# Altium footprint library HLib_footprint_Hien.PcbLib: 58 footprints (part 1 of 4)
Each footprint in its own frame and in the unit in brackets; x right, y up, seen from the top. Pads: shape width x height; smd on the part's side, far side on the other; paste and mask are expansions set on the pad; w line width, h text height; cw(c..) or ccw(c..) is an arc to the next point about the centre after c.
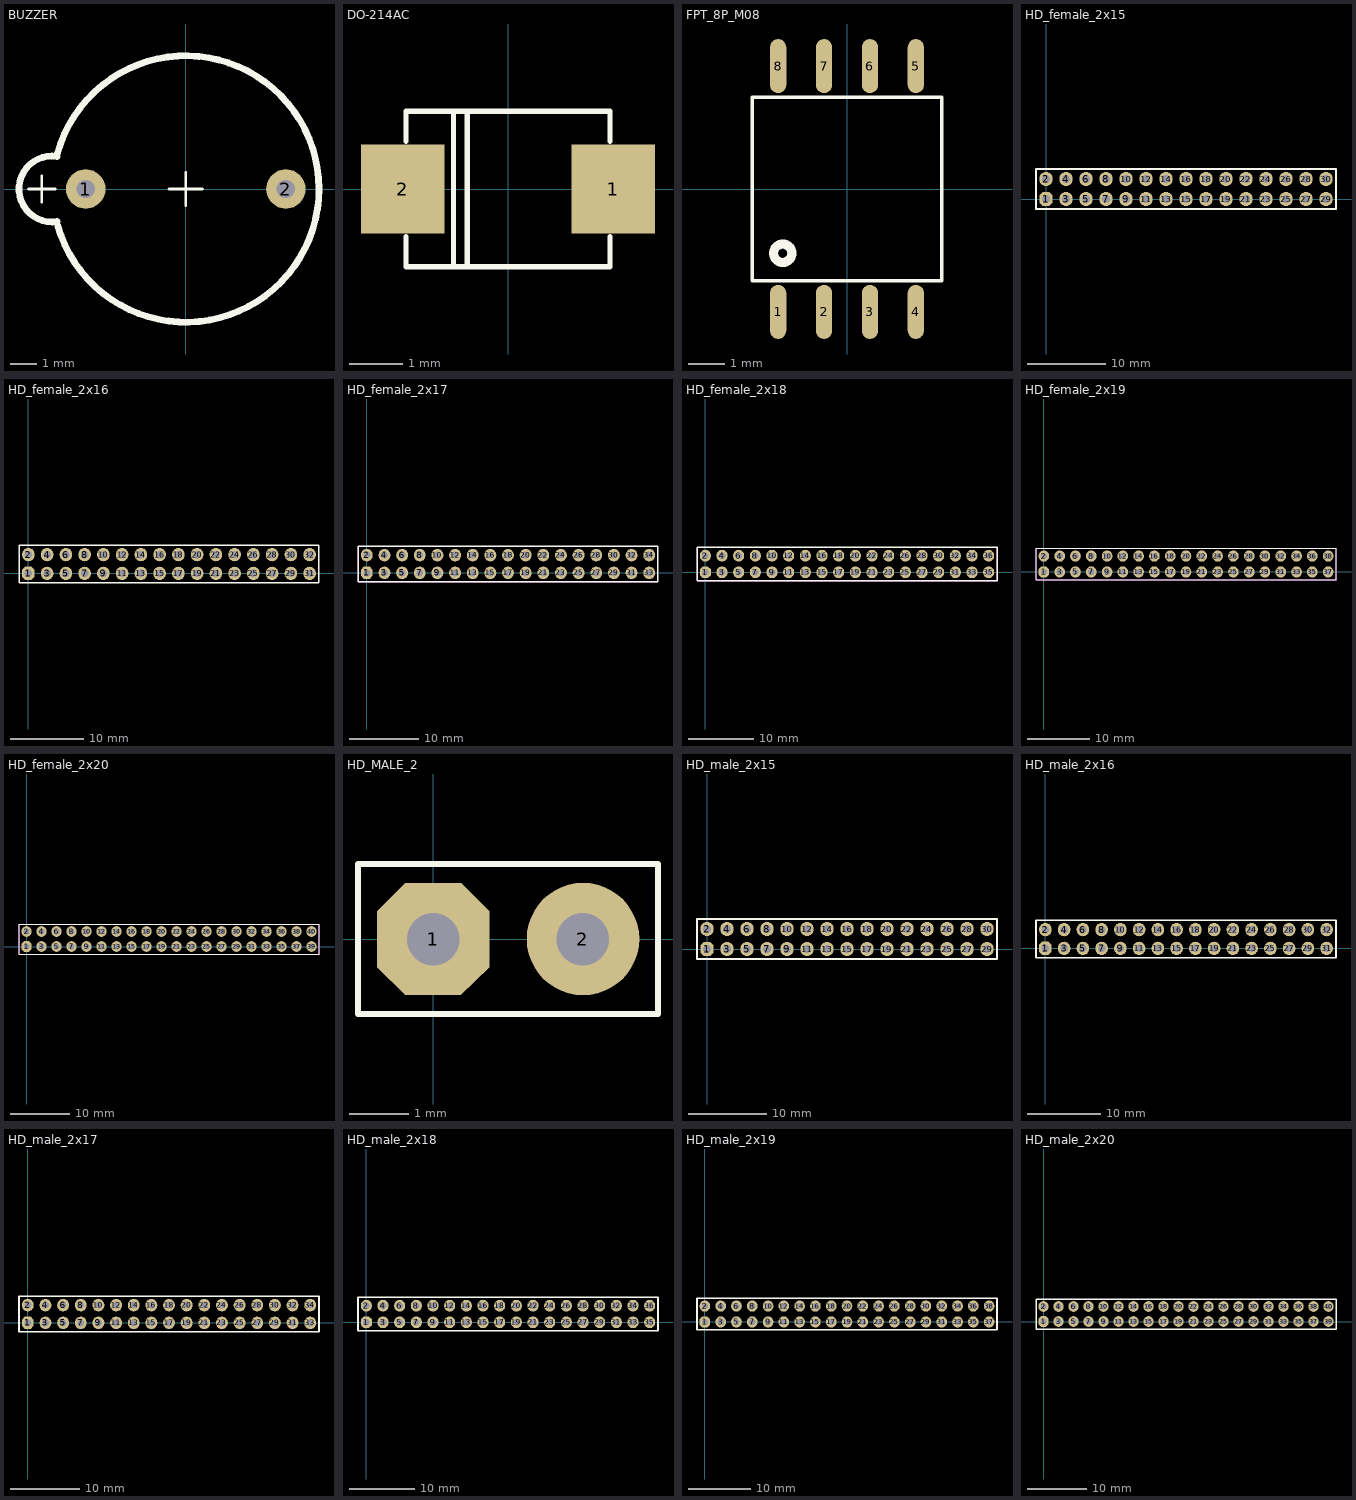
[diagram p0: the footprints below, top view; thin cyan lines are the x and y axes]

## BUZZER [mm]
pads (2):
  round 1.5 hole 0.7: 1(-3.8,0) 2(3.8,0)
Top Overlay:
  lines w0.1: -5.969,0 -4.953,0 ; -5.461,-0.508 -5.461,0.508 ; -0.635,0 0.635,0 ; 0,-0.635 0,0.635
  lines w0.254: -4.889,1.236 ccw(c-5.08,0) -4.886,-1.236 ; -4.869,1.363 cw(c0,0) -4.862,-1.389

## DO-214AC [mm]
pads (2):
  rect 1.555x1.67 smd: 1(1.965,0) 2(-1.965,0)
Top Overlay:
  lines w0.1: -1.905,-0.889 -1.905,-1.45 1.905,-1.45 1.905,-0.889 ; -1.905,0.889 -1.905,1.45 1.905,1.45 1.905,0.889 ; -1.016,-1.45 -1.016,1.45 ; -0.762,-1.45 -0.762,1.45
3D body: height 1.14, standoff -1.14, extent -2.743,-1.397 2.743,1.397

## FPT_8P_M08 [mm] "SOT8"
pads (8):
  oval 0.45x1.5 smd: 1(-1.905,-3.4) 2(-0.635,-3.4) 3(0.635,-3.4) 4(1.905,-3.4) 5(1.905,3.4) 6(0.635,3.4) 7(-0.635,3.4) 8(-1.905,3.4)
Top Overlay:
  circle w0.254: c-1.778,-1.778 r0.254
  lines w0.1: -2.62,-2.54 -2.62,2.54 2.62,2.54 2.62,-2.54 -2.62,-2.54
3D body: height 1.6, standoff 0, extent -2.51,-3.021 2.51,3.021

## HD_female_2x15 [mm]
pads (30):
  oct 1.7x1.8 hole 1: 1(0,0)
  oval 1.7x1.8 hole 1: 2(0,2.54) 3(2.54,0) 4(2.54,2.54) 5(5.08,0) 6(5.08,2.54) 7(7.62,0) 8(7.62,2.54) 9(10.16,0) 10(10.16,2.54) 11(12.7,0) 12(12.7,2.54) 13(15.24,0) 14(15.24,2.54) 15(17.78,0) 16(17.78,2.54) 17(20.32,0) 18(20.32,2.54) 19(22.86,0) 20(22.86,2.54) 21(25.4,0) 22(25.4,2.54) 23(27.94,0) 24(27.94,2.54) 25(30.48,0) 26(30.48,2.54) 27(33.02,0) 28(33.02,2.54) 29(35.56,0) 30(35.56,2.54)
Top Overlay:
  lines w0.2: -1.27,-1.27 -1.27,3.81 11.43,3.81 24.13,3.81 36.83,3.81 36.83,-1.27 24.13,-1.27 11.43,-1.27 -1.27,-1.27
Mechanical 15 keep-out:
  lines w0.1: -1.27,-1.27 -1.27,3.81 11.43,3.81 24.13,3.81 36.83,3.81 36.83,-1.27 24.13,-1.27 11.43,-1.27 -1.27,-1.27
3D body: height 8, standoff 0, extent 22.86,-1.27 24.13,3.81
3D body: height 8, standoff 0, extent 20.32,-1.27 21.59,3.81
3D body: height 8, standoff 0, extent 17.78,-1.27 19.05,3.81
3D body: height 8, standoff 0, extent 15.24,-1.27 16.51,3.81
3D body: height 8, standoff 0, extent 12.7,-1.27 13.97,3.81
3D body: height 8, standoff 0, extent 21.59,-1.27 22.86,3.81
3D body: height 8, standoff 0, extent 19.05,-1.27 20.32,3.81
3D body: height 8, standoff 0, extent 16.51,-1.27 17.78,3.81
3D body: height 8, standoff 0, extent 13.97,-1.27 15.24,3.81
3D body: height 8, standoff 0, extent 11.43,-1.27 12.7,3.81
3D body: height 0, standoff -1, extent 22.606,2.286 23.114,2.794
3D body: height 0, standoff -1, extent 22.606,-0.254 23.114,0.254
3D body: height 0, standoff -1, extent 20.066,2.286 20.574,2.794
3D body: height 0, standoff -1, extent 20.066,-0.254 20.574,0.254
3D body: height 0, standoff -1, extent 17.526,2.286 18.034,2.794
3D body: height 0, standoff -1, extent 17.526,-0.254 18.034,0.254
3D body: height 0, standoff -1, extent 14.986,2.286 15.494,2.794
3D body: height 0, standoff -1, extent 14.986,-0.254 15.494,0.254
3D body: height 0, standoff -1, extent 12.446,2.286 12.954,2.794
3D body: height 0, standoff -1, extent 12.446,-0.254 12.954,0.254
3D body: height 8, standoff 0, extent 10.16,-1.27 11.43,3.81
3D body: height 8, standoff 0, extent 7.62,-1.27 8.89,3.81
3D body: height 8, standoff 0, extent 5.08,-1.27 6.35,3.81
3D body: height 8, standoff 0, extent 2.54,-1.27 3.81,3.81
3D body: height 8, standoff 0, extent 0,-1.27 1.27,3.81
3D body: height 8, standoff 0, extent 8.89,-1.27 10.16,3.81
3D body: height 8, standoff 0, extent 6.35,-1.27 7.62,3.81
3D body: height 8, standoff 0, extent 3.81,-1.27 5.08,3.81
3D body: height 8, standoff 0, extent 1.27,-1.27 2.54,3.81
3D body: height 8, standoff 0, extent -1.27,-1.27 0,3.81
3D body: height 0, standoff -1, extent 9.906,2.286 10.414,2.794
3D body: height 0, standoff -1, extent 9.906,-0.254 10.414,0.254
3D body: height 0, standoff -1, extent 7.366,2.286 7.874,2.794
3D body: height 0, standoff -1, extent 7.366,-0.254 7.874,0.254
3D body: height 0, standoff -1, extent 4.826,2.286 5.334,2.794
3D body: height 0, standoff -1, extent 4.826,-0.254 5.334,0.254
3D body: height 0, standoff -1, extent 2.286,2.286 2.794,2.794
3D body: height 0, standoff -1, extent 2.286,-0.254 2.794,0.254
3D body: height 0, standoff -1, extent -0.254,2.286 0.254,2.794
3D body: height 0, standoff -1, extent -0.254,-0.254 0.254,0.254
3D body: height 0, standoff -1, extent 25.146,-0.254 25.654,0.254
3D body: height 0, standoff -1, extent 25.146,2.286 25.654,2.794
3D body: height 0, standoff -1, extent 27.686,-0.254 28.194,0.254
3D body: height 0, standoff -1, extent 27.686,2.286 28.194,2.794
3D body: height 0, standoff -1, extent 30.226,-0.254 30.734,0.254
3D body: height 0, standoff -1, extent 30.226,2.286 30.734,2.794
3D body: height 0, standoff -1, extent 32.766,-0.254 33.274,0.254
3D body: height 0, standoff -1, extent 32.766,2.286 33.274,2.794
3D body: height 0, standoff -1, extent 35.306,-0.254 35.814,0.254
3D body: height 0, standoff -1, extent 35.306,2.286 35.814,2.794
3D body: height 8, standoff 0, extent 24.13,-1.27 25.4,3.81
3D body: height 8, standoff 0, extent 26.67,-1.27 27.94,3.81
3D body: height 8, standoff 0, extent 29.21,-1.27 30.48,3.81
3D body: height 8, standoff 0, extent 31.75,-1.27 33.02,3.81
3D body: height 8, standoff 0, extent 34.29,-1.27 35.56,3.81
3D body: height 8, standoff 0, extent 25.4,-1.27 26.67,3.81
3D body: height 8, standoff 0, extent 27.94,-1.27 29.21,3.81
3D body: height 8, standoff 0, extent 30.48,-1.27 31.75,3.81
3D body: height 8, standoff 0, extent 33.02,-1.27 34.29,3.81
3D body: height 8, standoff 0, extent 35.56,-1.27 36.83,3.81

## HD_female_2x16 [mm]
pads (32):
  oct 1.7x1.8 hole 1: 1(0,0)
  oval 1.7x1.8 hole 1: 2(0,2.54) 3(2.54,0) 4(2.54,2.54) 5(5.08,0) 6(5.08,2.54) 7(7.62,0) 8(7.62,2.54) 9(10.16,0) 10(10.16,2.54) 11(12.7,0) 12(12.7,2.54) 13(15.24,0) 14(15.24,2.54) 15(17.78,0) 16(17.78,2.54) 17(20.32,0) 18(20.32,2.54) 19(22.86,0) 20(22.86,2.54) 21(25.4,0) 22(25.4,2.54) 23(27.94,0) 24(27.94,2.54) 25(30.48,0) 26(30.48,2.54) 27(33.02,0) 28(33.02,2.54) 29(35.56,0) 30(35.56,2.54) 31(38.1,0) 32(38.1,2.54)
Top Overlay:
  lines w0.2: -1.27,-1.27 -1.27,3.81 11.43,3.81 24.13,3.81 39.37,3.81 39.37,-1.27 24.13,-1.27 11.43,-1.27 -1.27,-1.27
3D body: height 8, standoff 0, extent 38.1,-1.27 39.37,3.81
3D body: height 8, standoff 0, extent 36.83,-1.27 38.1,3.81
3D body: height 0, standoff -1, extent 37.846,2.286 38.354,2.794
3D body: height 0, standoff -1, extent 37.846,-0.254 38.354,0.254
3D body: height 8, standoff 0, extent 22.86,-1.27 24.13,3.81
3D body: height 8, standoff 0, extent 20.32,-1.27 21.59,3.81
3D body: height 8, standoff 0, extent 17.78,-1.27 19.05,3.81
3D body: height 8, standoff 0, extent 15.24,-1.27 16.51,3.81
3D body: height 8, standoff 0, extent 12.7,-1.27 13.97,3.81
3D body: height 8, standoff 0, extent 21.59,-1.27 22.86,3.81
3D body: height 8, standoff 0, extent 19.05,-1.27 20.32,3.81
3D body: height 8, standoff 0, extent 16.51,-1.27 17.78,3.81
3D body: height 8, standoff 0, extent 13.97,-1.27 15.24,3.81
3D body: height 8, standoff 0, extent 11.43,-1.27 12.7,3.81
3D body: height 0, standoff -1, extent 22.606,2.286 23.114,2.794
3D body: height 0, standoff -1, extent 22.606,-0.254 23.114,0.254
3D body: height 0, standoff -1, extent 20.066,2.286 20.574,2.794
3D body: height 0, standoff -1, extent 20.066,-0.254 20.574,0.254
3D body: height 0, standoff -1, extent 17.526,2.286 18.034,2.794
3D body: height 0, standoff -1, extent 17.526,-0.254 18.034,0.254
3D body: height 0, standoff -1, extent 14.986,2.286 15.494,2.794
3D body: height 0, standoff -1, extent 14.986,-0.254 15.494,0.254
3D body: height 0, standoff -1, extent 12.446,2.286 12.954,2.794
3D body: height 0, standoff -1, extent 12.446,-0.254 12.954,0.254
3D body: height 8, standoff 0, extent 10.16,-1.27 11.43,3.81
3D body: height 8, standoff 0, extent 7.62,-1.27 8.89,3.81
3D body: height 8, standoff 0, extent 5.08,-1.27 6.35,3.81
3D body: height 8, standoff 0, extent 2.54,-1.27 3.81,3.81
3D body: height 8, standoff 0, extent 0,-1.27 1.27,3.81
3D body: height 8, standoff 0, extent 8.89,-1.27 10.16,3.81
3D body: height 8, standoff 0, extent 6.35,-1.27 7.62,3.81
3D body: height 8, standoff 0, extent 3.81,-1.27 5.08,3.81
3D body: height 8, standoff 0, extent 1.27,-1.27 2.54,3.81
3D body: height 8, standoff 0, extent -1.27,-1.27 0,3.81
3D body: height 0, standoff -1, extent 9.906,2.286 10.414,2.794
3D body: height 0, standoff -1, extent 9.906,-0.254 10.414,0.254
3D body: height 0, standoff -1, extent 7.366,2.286 7.874,2.794
3D body: height 0, standoff -1, extent 7.366,-0.254 7.874,0.254
3D body: height 0, standoff -1, extent 4.826,2.286 5.334,2.794
3D body: height 0, standoff -1, extent 4.826,-0.254 5.334,0.254
3D body: height 0, standoff -1, extent 2.286,2.286 2.794,2.794
3D body: height 0, standoff -1, extent 2.286,-0.254 2.794,0.254
3D body: height 0, standoff -1, extent -0.254,2.286 0.254,2.794
3D body: height 0, standoff -1, extent -0.254,-0.254 0.254,0.254
3D body: height 0, standoff -1, extent 25.146,-0.254 25.654,0.254
3D body: height 0, standoff -1, extent 25.146,2.286 25.654,2.794
3D body: height 0, standoff -1, extent 27.686,-0.254 28.194,0.254
3D body: height 0, standoff -1, extent 27.686,2.286 28.194,2.794
3D body: height 0, standoff -1, extent 30.226,-0.254 30.734,0.254
3D body: height 0, standoff -1, extent 30.226,2.286 30.734,2.794
3D body: height 0, standoff -1, extent 32.766,-0.254 33.274,0.254
3D body: height 0, standoff -1, extent 32.766,2.286 33.274,2.794
3D body: height 0, standoff -1, extent 35.306,-0.254 35.814,0.254
3D body: height 0, standoff -1, extent 35.306,2.286 35.814,2.794
3D body: height 8, standoff 0, extent 24.13,-1.27 25.4,3.81
3D body: height 8, standoff 0, extent 26.67,-1.27 27.94,3.81
3D body: height 8, standoff 0, extent 29.21,-1.27 30.48,3.81
3D body: height 8, standoff 0, extent 31.75,-1.27 33.02,3.81
3D body: height 8, standoff 0, extent 34.29,-1.27 35.56,3.81
3D body: height 8, standoff 0, extent 25.4,-1.27 26.67,3.81
3D body: height 8, standoff 0, extent 27.94,-1.27 29.21,3.81
3D body: height 8, standoff 0, extent 30.48,-1.27 31.75,3.81
3D body: height 8, standoff 0, extent 33.02,-1.27 34.29,3.81
3D body: height 8, standoff 0, extent 35.56,-1.27 36.83,3.81

## HD_female_2x17 [mm]
pads (34):
  oct 1.7x1.8 hole 1: 1(0,0)
  oval 1.7x1.8 hole 1: 2(0,2.54) 3(2.54,0) 4(2.54,2.54) 5(5.08,0) 6(5.08,2.54) 7(7.62,0) 8(7.62,2.54) 9(10.16,0) 10(10.16,2.54) 11(12.7,0) 12(12.7,2.54) 13(15.24,0) 14(15.24,2.54) 15(17.78,0) 16(17.78,2.54) 17(20.32,0) 18(20.32,2.54) 19(22.86,0) 20(22.86,2.54) 21(25.4,0) 22(25.4,2.54) 23(27.94,0) 24(27.94,2.54) 25(30.48,0) 26(30.48,2.54) 27(33.02,0) 28(33.02,2.54) 29(35.56,0) 30(35.56,2.54) 31(38.1,0) 32(38.1,2.54) 33(40.64,0) 34(40.64,2.54)
Top Overlay:
  lines w0.2: -1.27,-1.27 -1.27,3.81 11.43,3.81 24.13,3.81 41.91,3.81 41.91,-1.27 24.13,-1.27 11.43,-1.27 -1.27,-1.27
Mechanical 15 keep-out:
  lines w0.1: -1.27,-1.27 -1.27,3.81 11.43,3.81 24.13,3.81 41.91,3.81 41.91,-1.27 24.13,-1.27 11.43,-1.27 -1.27,-1.27
3D body: height 8, standoff 0, extent 22.86,-1.27 24.13,3.81
3D body: height 8, standoff 0, extent 20.32,-1.27 21.59,3.81
3D body: height 8, standoff 0, extent 17.78,-1.27 19.05,3.81
3D body: height 8, standoff 0, extent 15.24,-1.27 16.51,3.81
3D body: height 8, standoff 0, extent 12.7,-1.27 13.97,3.81
3D body: height 8, standoff 0, extent 21.59,-1.27 22.86,3.81
3D body: height 8, standoff 0, extent 19.05,-1.27 20.32,3.81
3D body: height 8, standoff 0, extent 16.51,-1.27 17.78,3.81
3D body: height 8, standoff 0, extent 13.97,-1.27 15.24,3.81
3D body: height 8, standoff 0, extent 11.43,-1.27 12.7,3.81
3D body: height 0, standoff -1, extent 22.606,2.286 23.114,2.794
3D body: height 0, standoff -1, extent 22.606,-0.254 23.114,0.254
3D body: height 0, standoff -1, extent 20.066,2.286 20.574,2.794
3D body: height 0, standoff -1, extent 20.066,-0.254 20.574,0.254
3D body: height 0, standoff -1, extent 17.526,2.286 18.034,2.794
3D body: height 0, standoff -1, extent 17.526,-0.254 18.034,0.254
3D body: height 0, standoff -1, extent 14.986,2.286 15.494,2.794
3D body: height 0, standoff -1, extent 14.986,-0.254 15.494,0.254
3D body: height 0, standoff -1, extent 12.446,2.286 12.954,2.794
3D body: height 0, standoff -1, extent 12.446,-0.254 12.954,0.254
3D body: height 8, standoff 0, extent 10.16,-1.27 11.43,3.81
3D body: height 8, standoff 0, extent 7.62,-1.27 8.89,3.81
3D body: height 8, standoff 0, extent 5.08,-1.27 6.35,3.81
3D body: height 8, standoff 0, extent 2.54,-1.27 3.81,3.81
3D body: height 8, standoff 0, extent 0,-1.27 1.27,3.81
3D body: height 8, standoff 0, extent 8.89,-1.27 10.16,3.81
3D body: height 8, standoff 0, extent 6.35,-1.27 7.62,3.81
3D body: height 8, standoff 0, extent 3.81,-1.27 5.08,3.81
3D body: height 8, standoff 0, extent 1.27,-1.27 2.54,3.81
3D body: height 8, standoff 0, extent -1.27,-1.27 0,3.81
3D body: height 0, standoff -1, extent 9.906,2.286 10.414,2.794
3D body: height 0, standoff -1, extent 9.906,-0.254 10.414,0.254
3D body: height 0, standoff -1, extent 7.366,2.286 7.874,2.794
3D body: height 0, standoff -1, extent 7.366,-0.254 7.874,0.254
3D body: height 0, standoff -1, extent 4.826,2.286 5.334,2.794
3D body: height 0, standoff -1, extent 4.826,-0.254 5.334,0.254
3D body: height 0, standoff -1, extent 2.286,2.286 2.794,2.794
3D body: height 0, standoff -1, extent 2.286,-0.254 2.794,0.254
3D body: height 0, standoff -1, extent -0.254,2.286 0.254,2.794
3D body: height 0, standoff -1, extent -0.254,-0.254 0.254,0.254
3D body: height 0, standoff -1, extent 25.146,-0.254 25.654,0.254
3D body: height 0, standoff -1, extent 25.146,2.286 25.654,2.794
3D body: height 0, standoff -1, extent 27.686,-0.254 28.194,0.254
3D body: height 0, standoff -1, extent 27.686,2.286 28.194,2.794
3D body: height 0, standoff -1, extent 30.226,-0.254 30.734,0.254
3D body: height 0, standoff -1, extent 30.226,2.286 30.734,2.794
3D body: height 0, standoff -1, extent 32.766,-0.254 33.274,0.254
3D body: height 0, standoff -1, extent 32.766,2.286 33.274,2.794
3D body: height 0, standoff -1, extent 35.306,-0.254 35.814,0.254
3D body: height 0, standoff -1, extent 35.306,2.286 35.814,2.794
3D body: height 8, standoff 0, extent 24.13,-1.27 25.4,3.81
3D body: height 8, standoff 0, extent 26.67,-1.27 27.94,3.81
3D body: height 8, standoff 0, extent 29.21,-1.27 30.48,3.81
3D body: height 8, standoff 0, extent 31.75,-1.27 33.02,3.81
3D body: height 8, standoff 0, extent 34.29,-1.27 35.56,3.81
3D body: height 8, standoff 0, extent 25.4,-1.27 26.67,3.81
3D body: height 8, standoff 0, extent 27.94,-1.27 29.21,3.81
3D body: height 8, standoff 0, extent 30.48,-1.27 31.75,3.81
3D body: height 8, standoff 0, extent 33.02,-1.27 34.29,3.81
3D body: height 8, standoff 0, extent 35.56,-1.27 36.83,3.81
3D body: height 8, standoff 0, extent 40.64,-1.27 41.91,3.81
3D body: height 8, standoff 0, extent 38.1,-1.27 39.37,3.81
3D body: height 8, standoff 0, extent 39.37,-1.27 40.64,3.81
3D body: height 8, standoff 0, extent 36.83,-1.27 38.1,3.81
3D body: height 0, standoff -1, extent 40.386,2.286 40.894,2.794
3D body: height 0, standoff -1, extent 40.386,-0.254 40.894,0.254
3D body: height 0, standoff -1, extent 37.846,2.286 38.354,2.794
3D body: height 0, standoff -1, extent 37.846,-0.254 38.354,0.254

## HD_female_2x18 [mm]
pads (36):
  oct 1.7x1.8 hole 1: 1(0,0)
  oval 1.7x1.8 hole 1: 2(0,2.54) 3(2.54,0) 4(2.54,2.54) 5(5.08,0) 6(5.08,2.54) 7(7.62,0) 8(7.62,2.54) 9(10.16,0) 10(10.16,2.54) 11(12.7,0) 12(12.7,2.54) 13(15.24,0) 14(15.24,2.54) 15(17.78,0) 16(17.78,2.54) 17(20.32,0) 18(20.32,2.54) 19(22.86,0) 20(22.86,2.54) 21(25.4,0) 22(25.4,2.54) 23(27.94,0) 24(27.94,2.54) 25(30.48,0) 26(30.48,2.54) 27(33.02,0) 28(33.02,2.54) 29(35.56,0) 30(35.56,2.54) 31(38.1,0) 32(38.1,2.54) 33(40.64,0) 34(40.64,2.54) 35(43.18,0) 36(43.18,2.54)
Top Overlay:
  lines w0.2: -1.27,-1.27 -1.27,3.81 11.43,3.81 24.13,3.81 44.45,3.81 44.45,-1.27 24.13,-1.27 11.43,-1.27 -1.27,-1.27
Mechanical 15 keep-out:
  lines w0.1: -1.27,-1.27 -1.27,3.81 11.43,3.81 24.13,3.81 44.45,3.81 44.45,-1.27 24.13,-1.27 11.43,-1.27 -1.27,-1.27
3D body: height 8, standoff 0, extent 22.86,-1.27 24.13,3.81
3D body: height 8, standoff 0, extent 20.32,-1.27 21.59,3.81
3D body: height 8, standoff 0, extent 17.78,-1.27 19.05,3.81
3D body: height 8, standoff 0, extent 15.24,-1.27 16.51,3.81
3D body: height 8, standoff 0, extent 12.7,-1.27 13.97,3.81
3D body: height 8, standoff 0, extent 21.59,-1.27 22.86,3.81
3D body: height 8, standoff 0, extent 19.05,-1.27 20.32,3.81
3D body: height 8, standoff 0, extent 16.51,-1.27 17.78,3.81
3D body: height 8, standoff 0, extent 13.97,-1.27 15.24,3.81
3D body: height 8, standoff 0, extent 11.43,-1.27 12.7,3.81
3D body: height 0, standoff -1, extent 22.606,2.286 23.114,2.794
3D body: height 0, standoff -1, extent 22.606,-0.254 23.114,0.254
3D body: height 0, standoff -1, extent 20.066,2.286 20.574,2.794
3D body: height 0, standoff -1, extent 20.066,-0.254 20.574,0.254
3D body: height 0, standoff -1, extent 17.526,2.286 18.034,2.794
3D body: height 0, standoff -1, extent 17.526,-0.254 18.034,0.254
3D body: height 0, standoff -1, extent 14.986,2.286 15.494,2.794
3D body: height 0, standoff -1, extent 14.986,-0.254 15.494,0.254
3D body: height 0, standoff -1, extent 12.446,2.286 12.954,2.794
3D body: height 0, standoff -1, extent 12.446,-0.254 12.954,0.254
3D body: height 8, standoff 0, extent 10.16,-1.27 11.43,3.81
3D body: height 8, standoff 0, extent 7.62,-1.27 8.89,3.81
3D body: height 8, standoff 0, extent 5.08,-1.27 6.35,3.81
3D body: height 8, standoff 0, extent 2.54,-1.27 3.81,3.81
3D body: height 8, standoff 0, extent 0,-1.27 1.27,3.81
3D body: height 8, standoff 0, extent 8.89,-1.27 10.16,3.81
3D body: height 8, standoff 0, extent 6.35,-1.27 7.62,3.81
3D body: height 8, standoff 0, extent 3.81,-1.27 5.08,3.81
3D body: height 8, standoff 0, extent 1.27,-1.27 2.54,3.81
3D body: height 8, standoff 0, extent -1.27,-1.27 0,3.81
3D body: height 0, standoff -1, extent 9.906,2.286 10.414,2.794
3D body: height 0, standoff -1, extent 9.906,-0.254 10.414,0.254
3D body: height 0, standoff -1, extent 7.366,2.286 7.874,2.794
3D body: height 0, standoff -1, extent 7.366,-0.254 7.874,0.254
3D body: height 0, standoff -1, extent 4.826,2.286 5.334,2.794
3D body: height 0, standoff -1, extent 4.826,-0.254 5.334,0.254
3D body: height 0, standoff -1, extent 2.286,2.286 2.794,2.794
3D body: height 0, standoff -1, extent 2.286,-0.254 2.794,0.254
3D body: height 0, standoff -1, extent -0.254,2.286 0.254,2.794
3D body: height 0, standoff -1, extent -0.254,-0.254 0.254,0.254
3D body: height 0, standoff -1, extent 25.146,-0.254 25.654,0.254
3D body: height 0, standoff -1, extent 25.146,2.286 25.654,2.794
3D body: height 0, standoff -1, extent 27.686,-0.254 28.194,0.254
3D body: height 0, standoff -1, extent 27.686,2.286 28.194,2.794
3D body: height 0, standoff -1, extent 30.226,-0.254 30.734,0.254
3D body: height 0, standoff -1, extent 30.226,2.286 30.734,2.794
3D body: height 0, standoff -1, extent 32.766,-0.254 33.274,0.254
3D body: height 0, standoff -1, extent 32.766,2.286 33.274,2.794
3D body: height 0, standoff -1, extent 35.306,-0.254 35.814,0.254
3D body: height 0, standoff -1, extent 35.306,2.286 35.814,2.794
3D body: height 8, standoff 0, extent 24.13,-1.27 25.4,3.81
3D body: height 8, standoff 0, extent 26.67,-1.27 27.94,3.81
3D body: height 8, standoff 0, extent 29.21,-1.27 30.48,3.81
3D body: height 8, standoff 0, extent 31.75,-1.27 33.02,3.81
3D body: height 8, standoff 0, extent 34.29,-1.27 35.56,3.81
3D body: height 8, standoff 0, extent 25.4,-1.27 26.67,3.81
3D body: height 8, standoff 0, extent 27.94,-1.27 29.21,3.81
3D body: height 8, standoff 0, extent 30.48,-1.27 31.75,3.81
3D body: height 8, standoff 0, extent 33.02,-1.27 34.29,3.81
3D body: height 8, standoff 0, extent 35.56,-1.27 36.83,3.81
3D body: height 8, standoff 0, extent 40.64,-1.27 41.91,3.81
3D body: height 8, standoff 0, extent 38.1,-1.27 39.37,3.81
3D body: height 8, standoff 0, extent 39.37,-1.27 40.64,3.81
3D body: height 8, standoff 0, extent 36.83,-1.27 38.1,3.81
3D body: height 0, standoff -1, extent 40.386,2.286 40.894,2.794
3D body: height 0, standoff -1, extent 40.386,-0.254 40.894,0.254
3D body: height 0, standoff -1, extent 37.846,2.286 38.354,2.794
3D body: height 0, standoff -1, extent 37.846,-0.254 38.354,0.254
3D body: height 0, standoff -1, extent 42.926,-0.254 43.434,0.254
3D body: height 0, standoff -1, extent 42.926,2.286 43.434,2.794
3D body: height 8, standoff 0, extent 41.91,-1.27 43.18,3.81
3D body: height 8, standoff 0, extent 43.18,-1.27 44.45,3.81

## HD_female_2x19 [mm]
pads (38):
  oct 1.7x1.8 hole 1: 1(0,0)
  oval 1.7x1.8 hole 1: 2(0,2.54) 3(2.54,0) 4(2.54,2.54) 5(5.08,0) 6(5.08,2.54) 7(7.62,0) 8(7.62,2.54) 9(10.16,0) 10(10.16,2.54) 11(12.7,0) 12(12.7,2.54) 13(15.24,0) 14(15.24,2.54) 15(17.78,0) 16(17.78,2.54) 17(20.32,0) 18(20.32,2.54) 19(22.86,0) 20(22.86,2.54) 21(25.4,0) 22(25.4,2.54) 23(27.94,0) 24(27.94,2.54) 25(30.48,0) 26(30.48,2.54) 27(33.02,0) 28(33.02,2.54) 29(35.56,0) 30(35.56,2.54) 31(38.1,0) 32(38.1,2.54) 33(40.64,0) 34(40.64,2.54) 35(43.18,0) 36(43.18,2.54) 37(45.72,0) 38(45.72,2.54)
Top Overlay:
  lines w0.2: -1.27,-1.27 -1.27,3.81 11.43,3.81 24.13,3.81 46.99,3.81 46.99,-1.27 24.13,-1.27 11.43,-1.27 -1.27,-1.27
Mechanical 15 keep-out:
  lines w0.1: -1.27,-1.27 -1.27,3.81 11.43,3.81 24.13,3.81 46.99,3.81 46.99,-1.27 24.13,-1.27 11.43,-1.27 -1.27,-1.27
3D body: height 8, standoff 0, extent 45.72,-1.27 46.99,3.81
3D body: height 8, standoff 0, extent 44.45,-1.27 45.72,3.81
3D body: height 8, standoff 0, extent 22.86,-1.27 24.13,3.81
3D body: height 8, standoff 0, extent 20.32,-1.27 21.59,3.81
3D body: height 8, standoff 0, extent 17.78,-1.27 19.05,3.81
3D body: height 8, standoff 0, extent 15.24,-1.27 16.51,3.81
3D body: height 8, standoff 0, extent 12.7,-1.27 13.97,3.81
3D body: height 8, standoff 0, extent 21.59,-1.27 22.86,3.81
3D body: height 8, standoff 0, extent 19.05,-1.27 20.32,3.81
3D body: height 8, standoff 0, extent 16.51,-1.27 17.78,3.81
3D body: height 8, standoff 0, extent 13.97,-1.27 15.24,3.81
3D body: height 8, standoff 0, extent 11.43,-1.27 12.7,3.81
3D body: height 0, standoff -1, extent 22.606,2.286 23.114,2.794
3D body: height 0, standoff -1, extent 22.606,-0.254 23.114,0.254
3D body: height 0, standoff -1, extent 20.066,2.286 20.574,2.794
3D body: height 0, standoff -1, extent 20.066,-0.254 20.574,0.254
3D body: height 0, standoff -1, extent 17.526,2.286 18.034,2.794
3D body: height 0, standoff -1, extent 17.526,-0.254 18.034,0.254
3D body: height 0, standoff -1, extent 14.986,2.286 15.494,2.794
3D body: height 0, standoff -1, extent 14.986,-0.254 15.494,0.254
3D body: height 0, standoff -1, extent 12.446,2.286 12.954,2.794
3D body: height 0, standoff -1, extent 12.446,-0.254 12.954,0.254
3D body: height 8, standoff 0, extent 10.16,-1.27 11.43,3.81
3D body: height 8, standoff 0, extent 7.62,-1.27 8.89,3.81
3D body: height 8, standoff 0, extent 5.08,-1.27 6.35,3.81
3D body: height 8, standoff 0, extent 2.54,-1.27 3.81,3.81
3D body: height 8, standoff 0, extent 0,-1.27 1.27,3.81
3D body: height 8, standoff 0, extent 8.89,-1.27 10.16,3.81
3D body: height 8, standoff 0, extent 6.35,-1.27 7.62,3.81
3D body: height 8, standoff 0, extent 3.81,-1.27 5.08,3.81
3D body: height 8, standoff 0, extent 1.27,-1.27 2.54,3.81
3D body: height 8, standoff 0, extent -1.27,-1.27 0,3.81
3D body: height 0, standoff -1, extent 9.906,2.286 10.414,2.794
3D body: height 0, standoff -1, extent 9.906,-0.254 10.414,0.254
3D body: height 0, standoff -1, extent 7.366,2.286 7.874,2.794
3D body: height 0, standoff -1, extent 7.366,-0.254 7.874,0.254
3D body: height 0, standoff -1, extent 4.826,2.286 5.334,2.794
3D body: height 0, standoff -1, extent 4.826,-0.254 5.334,0.254
3D body: height 0, standoff -1, extent 2.286,2.286 2.794,2.794
3D body: height 0, standoff -1, extent 2.286,-0.254 2.794,0.254
3D body: height 0, standoff -1, extent -0.254,2.286 0.254,2.794
3D body: height 0, standoff -1, extent -0.254,-0.254 0.254,0.254
3D body: height 0, standoff -1, extent 25.146,-0.254 25.654,0.254
3D body: height 0, standoff -1, extent 25.146,2.286 25.654,2.794
3D body: height 0, standoff -1, extent 27.686,-0.254 28.194,0.254
3D body: height 0, standoff -1, extent 27.686,2.286 28.194,2.794
3D body: height 0, standoff -1, extent 30.226,-0.254 30.734,0.254
3D body: height 0, standoff -1, extent 30.226,2.286 30.734,2.794
3D body: height 0, standoff -1, extent 32.766,-0.254 33.274,0.254
3D body: height 0, standoff -1, extent 32.766,2.286 33.274,2.794
3D body: height 0, standoff -1, extent 35.306,-0.254 35.814,0.254
3D body: height 0, standoff -1, extent 35.306,2.286 35.814,2.794
3D body: height 8, standoff 0, extent 24.13,-1.27 25.4,3.81
3D body: height 8, standoff 0, extent 26.67,-1.27 27.94,3.81
3D body: height 8, standoff 0, extent 29.21,-1.27 30.48,3.81
3D body: height 8, standoff 0, extent 31.75,-1.27 33.02,3.81
3D body: height 8, standoff 0, extent 34.29,-1.27 35.56,3.81
3D body: height 8, standoff 0, extent 25.4,-1.27 26.67,3.81
3D body: height 8, standoff 0, extent 27.94,-1.27 29.21,3.81
3D body: height 8, standoff 0, extent 30.48,-1.27 31.75,3.81
3D body: height 8, standoff 0, extent 33.02,-1.27 34.29,3.81
3D body: height 8, standoff 0, extent 35.56,-1.27 36.83,3.81
3D body: height 8, standoff 0, extent 40.64,-1.27 41.91,3.81
3D body: height 8, standoff 0, extent 38.1,-1.27 39.37,3.81
3D body: height 8, standoff 0, extent 39.37,-1.27 40.64,3.81
3D body: height 8, standoff 0, extent 36.83,-1.27 38.1,3.81
3D body: height 0, standoff -1, extent 40.386,2.286 40.894,2.794
3D body: height 0, standoff -1, extent 40.386,-0.254 40.894,0.254
3D body: height 0, standoff -1, extent 37.846,2.286 38.354,2.794
3D body: height 0, standoff -1, extent 37.846,-0.254 38.354,0.254
3D body: height 0, standoff -1, extent 42.926,-0.254 43.434,0.254
3D body: height 0, standoff -1, extent 42.926,2.286 43.434,2.794
3D body: height 8, standoff 0, extent 41.91,-1.27 43.18,3.81
3D body: height 8, standoff 0, extent 43.18,-1.27 44.45,3.81

## HD_female_2x20 [mm]
pads (40):
  oct 1.7x1.8 hole 1: 1(0,0)
  oval 1.7x1.8 hole 1: 2(0,2.54) 3(2.54,0) 4(2.54,2.54) 5(5.08,0) 6(5.08,2.54) 7(7.62,0) 8(7.62,2.54) 9(10.16,0) 10(10.16,2.54) 11(12.7,0) 12(12.7,2.54) 13(15.24,0) 14(15.24,2.54) 15(17.78,0) 16(17.78,2.54) 17(20.32,0) 18(20.32,2.54) 19(22.86,0) 20(22.86,2.54) 21(25.4,0) 22(25.4,2.54) 23(27.94,0) 24(27.94,2.54) 25(30.48,0) 26(30.48,2.54) 27(33.02,0) 28(33.02,2.54) 29(35.56,0) 30(35.56,2.54) 31(38.1,0) 32(38.1,2.54) 33(40.64,0) 34(40.64,2.54) 35(43.18,0) 36(43.18,2.54) 37(45.72,0) 38(45.72,2.54) 39(48.26,0) 40(48.26,2.54)
Top Overlay:
  lines w0.2: -1.27,-1.27 11.43,-1.27 24.13,-1.27 49.53,-1.27 49.53,3.81 24.13,3.81 11.43,3.81 -1.27,3.81 -1.27,-1.27
Mechanical 15 keep-out:
  lines w0.1: -1.27,-1.27 11.43,-1.27 24.13,-1.27 49.53,-1.27 49.53,3.81 24.13,3.81 11.43,3.81 -1.27,3.81 -1.27,-1.27
3D body: height 8, standoff 0, extent 43.18,-1.27 44.45,3.81
3D body: height 8, standoff 0, extent 41.91,-1.27 43.18,3.81
3D body: height 0, standoff -1, extent 42.926,2.286 43.434,2.794
3D body: height 0, standoff -1, extent 42.926,-0.254 43.434,0.254
3D body: height 0, standoff -1, extent 37.846,-0.254 38.354,0.254
3D body: height 0, standoff -1, extent 37.846,2.286 38.354,2.794
3D body: height 0, standoff -1, extent 40.386,-0.254 40.894,0.254
3D body: height 0, standoff -1, extent 40.386,2.286 40.894,2.794
3D body: height 8, standoff 0, extent 36.83,-1.27 38.1,3.81
3D body: height 8, standoff 0, extent 39.37,-1.27 40.64,3.81
3D body: height 8, standoff 0, extent 38.1,-1.27 39.37,3.81
3D body: height 8, standoff 0, extent 40.64,-1.27 41.91,3.81
3D body: height 8, standoff 0, extent 35.56,-1.27 36.83,3.81
3D body: height 8, standoff 0, extent 33.02,-1.27 34.29,3.81
3D body: height 8, standoff 0, extent 30.48,-1.27 31.75,3.81
3D body: height 8, standoff 0, extent 27.94,-1.27 29.21,3.81
3D body: height 8, standoff 0, extent 25.4,-1.27 26.67,3.81
3D body: height 8, standoff 0, extent 34.29,-1.27 35.56,3.81
3D body: height 8, standoff 0, extent 31.75,-1.27 33.02,3.81
3D body: height 8, standoff 0, extent 29.21,-1.27 30.48,3.81
3D body: height 8, standoff 0, extent 26.67,-1.27 27.94,3.81
3D body: height 8, standoff 0, extent 24.13,-1.27 25.4,3.81
3D body: height 0, standoff -1, extent 35.306,2.286 35.814,2.794
3D body: height 0, standoff -1, extent 35.306,-0.254 35.814,0.254
3D body: height 0, standoff -1, extent 32.766,2.286 33.274,2.794
3D body: height 0, standoff -1, extent 32.766,-0.254 33.274,0.254
3D body: height 0, standoff -1, extent 30.226,2.286 30.734,2.794
3D body: height 0, standoff -1, extent 30.226,-0.254 30.734,0.254
3D body: height 0, standoff -1, extent 27.686,2.286 28.194,2.794
3D body: height 0, standoff -1, extent 27.686,-0.254 28.194,0.254
3D body: height 0, standoff -1, extent 25.146,2.286 25.654,2.794
3D body: height 0, standoff -1, extent 25.146,-0.254 25.654,0.254
3D body: height 0, standoff -1, extent -0.254,-0.254 0.254,0.254
3D body: height 0, standoff -1, extent -0.254,2.286 0.254,2.794
3D body: height 0, standoff -1, extent 2.286,-0.254 2.794,0.254
3D body: height 0, standoff -1, extent 2.286,2.286 2.794,2.794
3D body: height 0, standoff -1, extent 4.826,-0.254 5.334,0.254
3D body: height 0, standoff -1, extent 4.826,2.286 5.334,2.794
3D body: height 0, standoff -1, extent 7.366,-0.254 7.874,0.254
3D body: height 0, standoff -1, extent 7.366,2.286 7.874,2.794
3D body: height 0, standoff -1, extent 9.906,-0.254 10.414,0.254
3D body: height 0, standoff -1, extent 9.906,2.286 10.414,2.794
3D body: height 8, standoff 0, extent -1.27,-1.27 0,3.81
3D body: height 8, standoff 0, extent 1.27,-1.27 2.54,3.81
3D body: height 8, standoff 0, extent 3.81,-1.27 5.08,3.81
3D body: height 8, standoff 0, extent 6.35,-1.27 7.62,3.81
3D body: height 8, standoff 0, extent 8.89,-1.27 10.16,3.81
3D body: height 8, standoff 0, extent 0,-1.27 1.27,3.81
3D body: height 8, standoff 0, extent 2.54,-1.27 3.81,3.81
3D body: height 8, standoff 0, extent 5.08,-1.27 6.35,3.81
3D body: height 8, standoff 0, extent 7.62,-1.27 8.89,3.81
3D body: height 8, standoff 0, extent 10.16,-1.27 11.43,3.81
3D body: height 0, standoff -1, extent 12.446,-0.254 12.954,0.254
3D body: height 0, standoff -1, extent 12.446,2.286 12.954,2.794
3D body: height 0, standoff -1, extent 14.986,-0.254 15.494,0.254
3D body: height 0, standoff -1, extent 14.986,2.286 15.494,2.794
3D body: height 0, standoff -1, extent 17.526,-0.254 18.034,0.254
3D body: height 0, standoff -1, extent 17.526,2.286 18.034,2.794
3D body: height 0, standoff -1, extent 20.066,-0.254 20.574,0.254
3D body: height 0, standoff -1, extent 20.066,2.286 20.574,2.794
3D body: height 0, standoff -1, extent 22.606,-0.254 23.114,0.254
3D body: height 0, standoff -1, extent 22.606,2.286 23.114,2.794
3D body: height 8, standoff 0, extent 11.43,-1.27 12.7,3.81
3D body: height 8, standoff 0, extent 13.97,-1.27 15.24,3.81
3D body: height 8, standoff 0, extent 16.51,-1.27 17.78,3.81
3D body: height 8, standoff 0, extent 19.05,-1.27 20.32,3.81
3D body: height 8, standoff 0, extent 21.59,-1.27 22.86,3.81
3D body: height 8, standoff 0, extent 12.7,-1.27 13.97,3.81
3D body: height 8, standoff 0, extent 15.24,-1.27 16.51,3.81
3D body: height 8, standoff 0, extent 17.78,-1.27 19.05,3.81
3D body: height 8, standoff 0, extent 20.32,-1.27 21.59,3.81
3D body: height 8, standoff 0, extent 22.86,-1.27 24.13,3.81
3D body: height 8, standoff 0, extent 44.45,-1.27 45.72,3.81
3D body: height 8, standoff 0, extent 45.72,-1.27 46.99,3.81
3D body: height 8, standoff 0, extent 48.26,-1.27 49.53,3.81
3D body: height 8, standoff 0, extent 46.99,-1.27 48.26,3.81

## HD_MALE_2 [mil]
pads (2):
  oct 75x75 hole 35: 1(0,0)
  round 75 hole 35: 2(100,0)
Top Overlay:
  lines w3.94: -50,-50 -50,50 150,50 150,-50 -50,-50
3D body: height 334.07, standoff -98.21, extent -50,-50 150,50

## HD_male_2x15 [mm]
pads (30):
  oct 1.7x1.8 hole 1: 1(0,0)
  oval 1.7x1.8 hole 1: 2(0,2.54) 3(2.54,0) 4(2.54,2.54) 5(5.08,0) 6(5.08,2.54) 7(7.62,0) 8(7.62,2.54) 9(10.16,0) 10(10.16,2.54) 11(12.7,0) 12(12.7,2.54) 13(15.24,0) 14(15.24,2.54) 15(17.78,0) 16(17.78,2.54) 17(20.32,0) 18(20.32,2.54) 19(22.86,0) 20(22.86,2.54) 21(25.4,0) 22(25.4,2.54) 23(27.94,0) 24(27.94,2.54) 25(30.48,0) 26(30.48,2.54) 27(33.02,0) 28(33.02,2.54) 29(35.56,0) 30(35.56,2.54)
Top Overlay:
  lines w0.254: -1.27,-1.27 -1.27,3.81 36.83,3.81 36.83,-1.27 -1.27,-1.27
3D body: height 9.5, standoff -3, extent -1.27,-1.27 36.83,3.81

## HD_male_2x16 [mm]
pads (32):
  oct 1.7x1.8 hole 1: 1(0,0)
  oval 1.7x1.8 hole 1: 2(0,2.54) 3(2.54,0) 4(2.54,2.54) 5(5.08,0) 6(5.08,2.54) 7(7.62,0) 8(7.62,2.54) 9(10.16,0) 10(10.16,2.54) 11(12.7,0) 12(12.7,2.54) 13(15.24,0) 14(15.24,2.54) 15(17.78,0) 16(17.78,2.54) 17(20.32,0) 18(20.32,2.54) 19(22.86,0) 20(22.86,2.54) 21(25.4,0) 22(25.4,2.54) 23(27.94,0) 24(27.94,2.54) 25(30.48,0) 26(30.48,2.54) 27(33.02,0) 28(33.02,2.54) 29(35.56,0) 30(35.56,2.54) 31(38.1,0) 32(38.1,2.54)
Top Overlay:
  lines w0.254: -1.27,-1.27 -1.27,3.81 39.37,3.81 39.37,-1.27 -1.27,-1.27
3D body: height 9.5, standoff -3, extent -1.27,-1.27 39.37,3.81

## HD_male_2x17 [mm]
pads (34):
  oct 1.7x1.8 hole 1: 1(0,0)
  oval 1.7x1.8 hole 1: 2(0,2.54) 3(2.54,0) 4(2.54,2.54) 5(5.08,0) 6(5.08,2.54) 7(7.62,0) 8(7.62,2.54) 9(10.16,0) 10(10.16,2.54) 11(12.7,0) 12(12.7,2.54) 13(15.24,0) 14(15.24,2.54) 15(17.78,0) 16(17.78,2.54) 17(20.32,0) 18(20.32,2.54) 19(22.86,0) 20(22.86,2.54) 21(25.4,0) 22(25.4,2.54) 23(27.94,0) 24(27.94,2.54) 25(30.48,0) 26(30.48,2.54) 27(33.02,0) 28(33.02,2.54) 29(35.56,0) 30(35.56,2.54) 31(38.1,0) 32(38.1,2.54) 33(40.64,0) 34(40.64,2.54)
Top Overlay:
  lines w0.254: -1.27,-1.27 41.91,-1.27 41.91,3.81 -1.27,3.81 -1.27,-1.27
3D body: height 9.5, standoff -3, extent -1.27,-1.27 41.91,3.81

## HD_male_2x18 [mm]
pads (36):
  oct 1.7x1.8 hole 1: 1(0,0)
  oval 1.7x1.8 hole 1: 2(0,2.54) 3(2.54,0) 4(2.54,2.54) 5(5.08,0) 6(5.08,2.54) 7(7.62,0) 8(7.62,2.54) 9(10.16,0) 10(10.16,2.54) 11(12.7,0) 12(12.7,2.54) 13(15.24,0) 14(15.24,2.54) 15(17.78,0) 16(17.78,2.54) 17(20.32,0) 18(20.32,2.54) 19(22.86,0) 20(22.86,2.54) 21(25.4,0) 22(25.4,2.54) 23(27.94,0) 24(27.94,2.54) 25(30.48,0) 26(30.48,2.54) 27(33.02,0) 28(33.02,2.54) 29(35.56,0) 30(35.56,2.54) 31(38.1,0) 32(38.1,2.54) 33(40.64,0) 34(40.64,2.54) 35(43.18,0) 36(43.18,2.54)
Top Overlay:
  lines w0.254: -1.27,-1.27 -1.27,3.81 44.45,3.81 44.45,-1.27 -1.27,-1.27
3D body: height 9.5, standoff -3, extent -1.27,-1.27 44.45,3.81

## HD_male_2x19 [mm]
pads (38):
  oct 1.7x1.8 hole 1: 1(0,0)
  oval 1.7x1.8 hole 1: 2(0,2.54) 3(2.54,0) 4(2.54,2.54) 5(5.08,0) 6(5.08,2.54) 7(7.62,0) 8(7.62,2.54) 9(10.16,0) 10(10.16,2.54) 11(12.7,0) 12(12.7,2.54) 13(15.24,0) 14(15.24,2.54) 15(17.78,0) 16(17.78,2.54) 17(20.32,0) 18(20.32,2.54) 19(22.86,0) 20(22.86,2.54) 21(25.4,0) 22(25.4,2.54) 23(27.94,0) 24(27.94,2.54) 25(30.48,0) 26(30.48,2.54) 27(33.02,0) 28(33.02,2.54) 29(35.56,0) 30(35.56,2.54) 31(38.1,0) 32(38.1,2.54) 33(40.64,0) 34(40.64,2.54) 35(43.18,0) 36(43.18,2.54) 37(45.72,0) 38(45.72,2.54)
Top Overlay:
  lines w0.254: -1.27,-1.27 46.99,-1.27 46.99,3.81 -1.27,3.81 -1.27,-1.27
3D body: height 9.5, standoff -3, extent -1.27,-1.27 46.99,3.81

## HD_male_2x20 [mm]
pads (40):
  oct 1.7x1.8 hole 1: 1(0,0)
  oval 1.7x1.8 hole 1: 2(0,2.54) 3(2.54,0) 4(2.54,2.54) 5(5.08,0) 6(5.08,2.54) 7(7.62,0) 8(7.62,2.54) 9(10.16,0) 10(10.16,2.54) 11(12.7,0) 12(12.7,2.54) 13(15.24,0) 14(15.24,2.54) 15(17.78,0) 16(17.78,2.54) 17(20.32,0) 18(20.32,2.54) 19(22.86,0) 20(22.86,2.54) 21(25.4,0) 22(25.4,2.54) 23(27.94,0) 24(27.94,2.54) 25(30.48,0) 26(30.48,2.54) 27(33.02,0) 28(33.02,2.54) 29(35.56,0) 30(35.56,2.54) 31(38.1,0) 32(38.1,2.54) 33(40.64,0) 34(40.64,2.54) 35(43.18,0) 36(43.18,2.54) 37(45.72,0) 38(45.72,2.54) 39(48.26,0) 40(48.26,2.54)
Top Overlay:
  lines w0.254: -1.27,-1.27 -1.27,3.81 49.53,3.81 49.53,-1.27 -1.27,-1.27
3D body: height 9.5, standoff -3, extent -1.27,-1.27 49.53,3.81